# Altium footprint library TYCO THD.PcbLib: 146 footprints (part 1 of 11)
Each footprint in its own frame and in the unit in brackets; x right, y up, seen from the top. Pads: shape width x height; smd on the part's side, far side on the other; paste and mask are expansions set on the pad; w line width, h text height; cw(c..) or ccw(c..) is an arc to the next point about the centre after c.
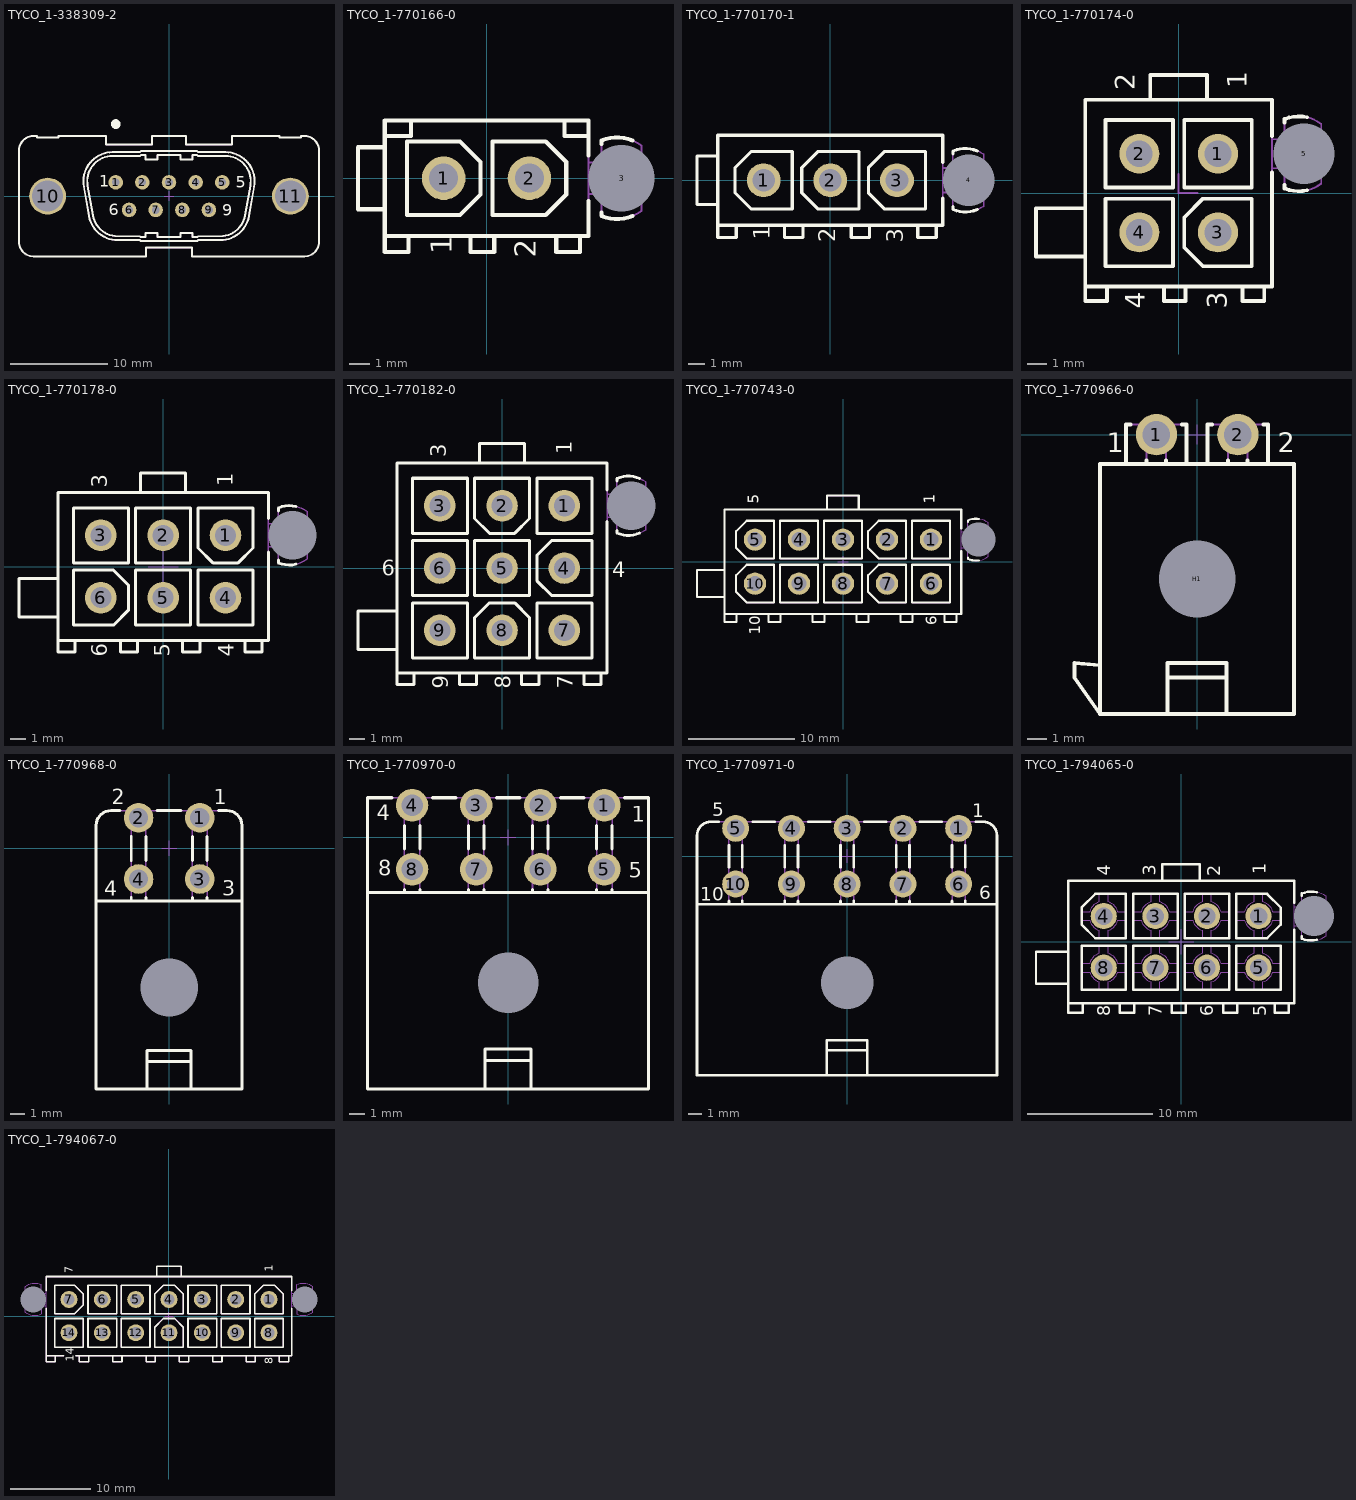
[diagram p0: the footprints below, top view; thin cyan lines are the x and y axes]

## TYCO_1-338309-2 [mm] "Straight D-SUB 9 Male Contacts Connector with Harpoons and Female Screwlock (UNC4-40)"
height 11.7
pads (11):
  round 1.5 hole 0.8: 1(-5.486,1.423) 2(-2.743,1.423) 3(0,1.423) 4(2.743,1.423) 5(5.486,1.423) 6(-4.114,-1.423) 7(-1.371,-1.423) 8(1.372,-1.423) 9(4.115,-1.423)
  round 3.8 hole 3.2: 10(-12.495,0) 11(12.495,0)
Top Overlay:
  circle w0.5: c-5.48,7.42 r0.25
  lines w0.2: -8.774,1.009 cw(c-5.82,1.53) -5.82,4.53 ; -8.774,1.009 cw(c-5.82,1.53) -5.82,4.53 ; -8.774,1.009 -8.235,-2.051 ; -8.774,1.009 -8.235,-2.051 ; -8.381,1.079 cw(c-5.82,1.53) -5.82,4.13 ; -8.381,1.079 cw(c-5.82,1.53) -5.82,4.13 ; -8.381,1.079 -7.841,-1.981 ; -8.381,1.079 -7.841,-1.981 ; -8.235,-2.051 ccw(c-5.28,-1.53) -5.28,-4.53 ; -8.235,-2.051 ccw(c-5.28,-1.53) -5.28,-4.53 ; -7.841,-1.981 ccw(c-5.28,-1.53) -5.28,-4.13 ; -7.841,-1.981 ccw(c-5.28,-1.53) -5.28,-4.13 ; -5.82,4.13 -3,4.13 ; -5.82,4.13 -3,4.13 ; -5.82,4.53 -3,4.53 ; -5.82,4.53 -3,4.53 ; -5.28,-4.53 -3,-4.53 ; -5.28,-4.53 -3,-4.53 ; -5.28,-4.13 -3,-4.13 ; -5.28,-4.13 -3,-4.13 ; -3,-4.53 -2.9,-4.63 ; -3,-4.53 -2.9,-4.63 ; -3,-4.13 -2.9,-4.23 ; -3,-4.13 -2.9,-4.23 ; -3,4.13 -2.9,4.23 ; -3,4.13 -2.9,4.23 ; -3,4.53 -2.9,4.63 ; -3,4.53 -2.9,4.63 ; -2.9,-4.63 2.9,-4.63 ; -2.9,-4.63 2.9,-4.63 ; -2.9,-4.23 -2.4,-4.23 ; -2.9,-4.23 -2.4,-4.23 ; -2.9,4.23 -2.4,4.23 ; -2.9,4.23 -2.4,4.23 ; -2.9,4.63 2.9,4.63 ; -2.9,4.63 2.9,4.63 ; -2.4,-4.23 -2.4,-3.775 ; -2.4,-4.23 -2.4,-3.775 ; -2.4,-3.775 -1.2,-3.775 ; -2.4,-3.775 -1.2,-3.775 ; -2.4,3.775 -1.2,3.775 ; -2.4,3.775 -2.4,4.23 ; -2.4,3.775 -1.2,3.775 ; -2.4,3.775 -2.4,4.23 ; -1.2,-4.23 -1.2,-3.775 ; -1.2,-4.23 1.2,-4.23 ; -1.2,-4.23 -1.2,-3.775 ; -1.2,-4.23 1.2,-4.23 ; -1.2,3.775 -1.2,4.23 ; -1.2,3.775 -1.2,4.23 ; -1.2,4.23 1.2,4.23 ; -1.2,4.23 1.2,4.23 ; 1.2,-4.23 1.2,-3.775 ; 1.2,-4.23 1.2,-3.775 ; 1.2,-3.775 2.4,-3.775 ; 1.2,-3.775 2.4,-3.775 ; 1.2,3.775 2.4,3.775 ; 1.2,3.775 1.2,4.23 ; 1.2,3.775 2.4,3.775 ; 1.2,3.775 1.2,4.23 ; 2.4,-4.23 2.4,-3.775 ; 2.4,-4.23 2.9,-4.23 ; 2.4,-4.23 2.4,-3.775 ; 2.4,-4.23 2.9,-4.23 ; 2.4,3.775 2.4,4.23 ; 2.4,3.775 2.4,4.23 ; 2.4,4.23 2.9,4.23 ; 2.4,4.23 2.9,4.23 ; 2.9,-4.63 3,-4.53 ; 2.9,-4.63 3,-4.53 ; 2.9,-4.23 3,-4.13 ; 2.9,-4.23 3,-4.13 ; 2.9,4.23 3,4.13 ; 2.9,4.23 3,4.13 ; 2.9,4.63 3,4.53 ; 2.9,4.63 3,4.53 ; 3,-4.53 5.28,-4.53 ; 3,-4.53 5.28,-4.53 ; 3,-4.13 5.28,-4.13 ; 3,-4.13 5.28,-4.13 ; 3,4.13 5.82,4.13 ; 3,4.13 5.82,4.13 ; 3,4.53 5.82,4.53 ; 3,4.53 5.82,4.53 ; 5.28,-4.53 ccw(c5.28,-1.53) 8.235,-2.051 ; 5.28,-4.53 ccw(c5.28,-1.53) 8.235,-2.051 ; 5.28,-4.13 ccw(c5.28,-1.53) 7.841,-1.981 ; 5.28,-4.13 ccw(c5.28,-1.53) 7.841,-1.981 ; 5.82,4.13 cw(c5.82,1.53) 8.381,1.079 ; 5.82,4.13 cw(c5.82,1.53) 8.381,1.079 ; 5.82,4.53 cw(c5.82,1.53) 8.774,1.009 ; 5.82,4.53 cw(c5.82,1.53) 8.774,1.009 ; 7.841,-1.981 8.381,1.079 ; 7.841,-1.981 8.381,1.079 ; 8.235,-2.051 8.774,1.009 ; 8.235,-2.051 8.774,1.009 ; -15.445,-4.7 ccw(c-13.945,-4.7) -13.945,-6.2 -2.375,-6.2 -2.375,-5.3 2.375,-5.3 2.375,-6.2 13.945,-6.2 ccw(c13.945,-4.7) 15.445,-4.7 15.445,4.7 ccw(c13.945,4.7) 13.945,6.2 13.595,6.2 13.595,6.05 11.395,6.05 11.395,6.2 6.485,6.2 6.485,5.3 1.735,5.3 1.735,6.2 -1.735,6.2 -1.735,5.3 -6.485,5.3 -6.485,6.2 -11.395,6.2 -11.395,6.05 -13.595,6.05 -13.595,6.2 -13.945,6.2 ccw(c-13.945,4.7) -15.445,4.7 -15.445,-4.7
  text "6" at -6.21,-1.97 h1.2
  text "5" at 6.855,0.87 h1.2
  text "1" at -7.18,0.945 h1.2
  text "9" at 5.485,-2.02 h1.2
Mechanical 8:
  lines w0.1: -12.995,0 -12.495,0 ; -12.495,-0.5 -12.495,0 ; -12.495,0.5 -12.495,0 ; -11.995,0 -12.495,0 ; -5.986,1.423 -5.486,1.423 ; -5.486,0.923 -5.486,1.423 ; -5.486,1.923 -5.486,1.423 ; -4.986,1.423 -5.486,1.423 ; -4.614,-1.423 -4.114,-1.423 ; -4.114,-1.923 -4.114,-1.423 ; -4.114,-0.923 -4.114,-1.423 ; -3.614,-1.423 -4.114,-1.423 ; -3.243,1.423 -2.743,1.423 ; -2.743,0.923 -2.743,1.423 ; -2.743,1.923 -2.743,1.423 ; -2.243,1.423 -2.743,1.423 ; -1.871,-1.423 -1.371,-1.423 ; -1.371,-1.923 -1.371,-1.423 ; -1.371,-0.923 -1.371,-1.423 ; -0.871,-1.423 -1.371,-1.423 ; -0.5,0 0,0 ; -0.5,1.423 0,1.423 ; 0,-0.5 0,0 ; 0,0.5 0,0 ; 0,0.923 0,1.423 ; 0,1.923 0,1.423 ; 0.5,0 0,0 ; 0.5,1.423 0,1.423 ; 0.872,-1.423 1.372,-1.423 ; 1.372,-1.923 1.372,-1.423 ; 1.372,-0.923 1.372,-1.423 ; 1.872,-1.423 1.372,-1.423 ; 2.243,1.423 2.743,1.423 ; 2.743,0.923 2.743,1.423 ; 2.743,1.923 2.743,1.423 ; 3.243,1.423 2.743,1.423 ; 3.615,-1.423 4.115,-1.423 ; 4.115,-1.923 4.115,-1.423 ; 4.115,-0.923 4.115,-1.423 ; 4.615,-1.423 4.115,-1.423 ; 4.986,1.423 5.486,1.423 ; 5.486,0.923 5.486,1.423 ; 5.486,1.923 5.486,1.423 ; 5.986,1.423 5.486,1.423 ; 11.995,0 12.495,0 ; 12.495,-0.5 12.495,0 ; 12.495,0.5 12.495,0 ; 12.995,0 12.495,0
Mechanical 14:
  circle w0.1: c12.495,0 r1.422
  circle w0.1: c-12.495,0 r1.422
  circle w0.1: c-5.486,1.422 r0.51
  circle w0.1: c-2.74,1.42 r0.51
  circle w0.1: c0,1.42 r0.51
  circle w0.1: c-4.11,-1.42 r0.51
  circle w0.1: c-1.37,-1.42 r0.51
  circle w0.1: c1.37,-1.42 r0.51
  circle w0.1: c2.74,1.42 r0.51
  circle w0.1: c5.48,1.42 r0.51
  circle w0.1: c4.11,-1.42 r0.51
  lines w0.1: -8.774,1.009 cw(c-5.82,1.53) -5.82,4.53 ; -8.774,1.009 cw(c-5.82,1.53) -5.82,4.53 ; -8.774,1.009 -8.235,-2.051 ; -8.774,1.009 -8.235,-2.051 ; -8.381,1.079 cw(c-5.82,1.53) -5.82,4.13 ; -8.381,1.079 cw(c-5.82,1.53) -5.82,4.13 ; -8.381,1.079 -7.841,-1.981 ; -8.381,1.079 -7.841,-1.981 ; -8.235,-2.051 ccw(c-5.28,-1.53) -5.28,-4.53 ; -8.235,-2.051 ccw(c-5.28,-1.53) -5.28,-4.53 ; -7.841,-1.981 ccw(c-5.28,-1.53) -5.28,-4.13 ; -7.841,-1.981 ccw(c-5.28,-1.53) -5.28,-4.13 ; -5.82,4.13 -3,4.13 ; -5.82,4.13 -3,4.13 ; -5.82,4.53 -3,4.53 ; -5.82,4.53 -3,4.53 ; -5.28,-4.53 -3,-4.53 ; -5.28,-4.53 -3,-4.53 ; -5.28,-4.13 -3,-4.13 ; -5.28,-4.13 -3,-4.13 ; -3,-4.53 -2.9,-4.63 ; -3,-4.53 -2.9,-4.63 ; -3,-4.13 -2.9,-4.23 ; -3,-4.13 -2.9,-4.23 ; -3,4.13 -2.9,4.23 ; -3,4.13 -2.9,4.23 ; -3,4.53 -2.9,4.63 ; -3,4.53 -2.9,4.63 ; -2.9,-4.63 2.9,-4.63 ; -2.9,-4.63 2.9,-4.63 ; -2.9,-4.23 -2.4,-4.23 ; -2.9,-4.23 -2.4,-4.23 ; -2.9,4.23 -2.4,4.23 ; -2.9,4.23 -2.4,4.23 ; -2.9,4.63 2.9,4.63 ; -2.9,4.63 2.9,4.63 ; -2.4,-4.23 -2.4,-3.775 ; -2.4,-4.23 -2.4,-3.775 ; -2.4,-3.775 -1.2,-3.775 ; -2.4,-3.775 -1.2,-3.775 ; -2.4,3.775 -1.2,3.775 ; -2.4,3.775 -2.4,4.23 ; -2.4,3.775 -2.4,4.23 ; -2.4,3.775 -1.2,3.775 ; -1.2,-4.23 -1.2,-3.775 ; -1.2,-4.23 1.2,-4.23 ; -1.2,-4.23 1.2,-4.23 ; -1.2,-4.23 -1.2,-3.775 ; -1.2,3.775 -1.2,4.23 ; -1.2,3.775 -1.2,4.23 ; -1.2,4.23 1.2,4.23 ; -1.2,4.23 1.2,4.23 ; 1.2,-4.23 1.2,-3.775 ; 1.2,-4.23 1.2,-3.775 ; 1.2,-3.775 2.4,-3.775 ; 1.2,-3.775 2.4,-3.775 ; 1.2,3.775 2.4,3.775 ; 1.2,3.775 1.2,4.23 ; 1.2,3.775 1.2,4.23 ; 1.2,3.775 2.4,3.775 ; 2.4,-4.23 2.4,-3.775 ; 2.4,-4.23 2.9,-4.23 ; 2.4,-4.23 2.9,-4.23 ; 2.4,-4.23 2.4,-3.775 ; 2.4,3.775 2.4,4.23 ; 2.4,3.775 2.4,4.23 ; 2.4,4.23 2.9,4.23 ; 2.4,4.23 2.9,4.23 ; 2.9,-4.63 3,-4.53 ; 2.9,-4.63 3,-4.53 ; 2.9,-4.23 3,-4.13 ; 2.9,-4.23 3,-4.13 ; 2.9,4.23 3,4.13 ; 2.9,4.23 3,4.13 ; 2.9,4.63 3,4.53 ; 2.9,4.63 3,4.53 ; 3,-4.53 5.28,-4.53 ; 3,-4.53 5.28,-4.53 ; 3,-4.13 5.28,-4.13 ; 3,-4.13 5.28,-4.13 ; 3,4.13 5.82,4.13 ; 3,4.13 5.82,4.13 ; 3,4.53 5.82,4.53 ; 3,4.53 5.82,4.53 ; 5.28,-4.53 ccw(c5.28,-1.53) 8.235,-2.051 ; 5.28,-4.53 ccw(c5.28,-1.53) 8.235,-2.051 ; 5.28,-4.13 ccw(c5.28,-1.53) 7.841,-1.981 ; 5.28,-4.13 ccw(c5.28,-1.53) 7.841,-1.981 ; 5.82,4.13 cw(c5.82,1.53) 8.381,1.079 ; 5.82,4.13 cw(c5.82,1.53) 8.381,1.079 ; 5.82,4.53 cw(c5.82,1.53) 8.774,1.009 ; 5.82,4.53 cw(c5.82,1.53) 8.774,1.009 ; 7.841,-1.981 8.381,1.079 ; 7.841,-1.981 8.381,1.079 ; 8.235,-2.051 8.774,1.009 ; 8.235,-2.051 8.774,1.009 ; -15.445,-4.7 ccw(c-13.945,-4.7) -13.945,-6.2 -2.375,-6.2 -2.375,-5.3 2.375,-5.3 2.375,-6.2 13.945,-6.2 ccw(c13.945,-4.7) 15.445,-4.7 15.445,4.7 ccw(c13.945,4.7) 13.945,6.2 13.595,6.2 13.595,6.05 11.395,6.05 11.395,6.2 6.485,6.2 6.485,5.3 1.735,5.3 1.735,6.2 -1.735,6.2 -1.735,5.3 -6.485,5.3 -6.485,6.2 -11.395,6.2 -11.395,6.05 -13.595,6.05 -13.595,6.2 -13.945,6.2 ccw(c-13.945,4.7) -15.445,4.7 -15.445,-4.7
  text "9 D-Sub Male" at -6.053,4.872 h1.2
3D body "TYCO_1-338309-2.stp": height 11.95, standoff -3.2, extent -15.445,-6.2 15.445,6.2

## TYCO_1-770166-0 [mm] "2 Circuits In-Line - Mini-Universal MATE-N-LOK Connector"
height 14.25
pads (3):
  round 2.1 hole 1.4: 1(-2.07,0) 2(2.07,0)
  round 0.5 hole 3.2 unplated mask+1.35: 3(6.52,0)
Top Overlay:
  lines w0.2: -4.915,-1.499 -6.21,-1.499 -6.21,1.499 -4.915,1.499 ; -4.915,2.032 -3.645,2.032 -3.645,2.794 ; -3.772,-2.794 -3.772,-3.556 -4.915,-3.556 -4.915,-2.794 ; -0.775,-2.794 -0.775,-3.556 0.368,-3.556 0.368,-2.794 ; 3.366,-2.794 3.366,-3.556 4.509,-3.556 4.509,-2.794 ; 3.772,2.794 3.772,2.032 4.915,2.032 ; 4.915,-1.1 4.915,-2.794 -4.915,-2.794 ; 4.915,1.1 4.915,2.794 -4.915,2.794 -4.915,-2.794 ; 5.55,-1.651 5.55,-1.815 ccw(c6.312,0) 7.053,-1.824 ; 5.55,1.651 5.55,1.815 cw(c6.312,0) 7.053,1.824 ; -3.848,-1.778 -3.848,1.778 -1.283,1.778 -0.292,0.787 -0.292,-0.787 -1.283,-1.778 -3.848,-1.778 ; 0.292,-1.778 0.292,1.778 2.858,1.778 3.848,0.787 3.848,-0.787 2.858,-1.778 0.292,-1.778
  text "1" at -1.689,-3.683 h1.02
  text "2" at 2.375,-3.835 h1.02
Mechanical 14:
  circle w0.1: c-2.07,0 r0.5
  circle w0.1: c2.07,0 r0.5
  lines w0.1: -4.915,-1.499 -6.21,-1.499 -6.21,1.499 -4.915,1.499 ; -4.915,2.032 -3.645,2.032 -3.645,2.794 ; -3.772,-2.794 -3.772,-3.556 -4.915,-3.556 -4.915,-2.794 ; -0.775,-2.794 -0.775,-3.556 0.368,-3.556 0.368,-2.794 ; 3.366,-2.794 3.366,-3.556 4.509,-3.556 4.509,-2.794 ; 3.772,2.794 3.772,2.032 4.915,2.032 ; 4.915,-0.762 5.55,-0.762 5.55,-1.815 ccw(c6.312,0) 7.48,-1.584 7.48,1.584 ccw(c6.312,0) 5.55,1.815 5.55,0.762 4.915,0.762 ; -4.915,-2.794 -4.915,2.794 4.915,2.794 4.915,-2.794 -4.915,-2.794 ; -3.848,-1.778 -3.848,1.778 -1.283,1.778 -0.292,0.787 -0.292,-0.787 -1.283,-1.778 -3.848,-1.778 ; 0.292,-1.778 0.292,1.778 2.858,1.778 3.848,0.787 3.848,-0.787 2.858,-1.778 0.292,-1.778
  text "1" at -1.689,-3.683 h1.02
  text "2" at 2.375,-3.835 h1.02
3D body "TYCO_1-770166-0.stp": height 14.25, standoff -4.32, extent -6.21,-3.556 7.481,2.794

## TYCO_1-770170-1 [mm] "3 Circuits In-Line - Mini-Universal MATE-N-LOK Connector"
height 14.25
pads (4):
  round 2.1 hole 1.4: 1(-4.14,0) 2(0,0) 3(4.14,0)
  round 0.5 hole 3.2 unplated mask+1.35: 4(8.59,0)
Top Overlay:
  lines w0.2: -6.985,-2.794 6.985,-2.794 6.985,-1.1 ; -6.985,-1.499 -8.28,-1.499 -8.28,1.499 -6.985,1.499 ; -5.842,-2.794 -5.842,-3.556 -6.985,-3.556 -6.985,2.794 6.985,2.794 6.985,1.1 ; -2.845,-2.794 -2.845,-3.556 -1.702,-3.556 -1.702,-2.794 ; 1.295,-2.794 1.295,-3.556 2.438,-3.556 2.438,-2.794 ; 5.436,-2.794 5.436,-3.556 6.579,-3.556 6.579,-2.794 ; 7.62,-1.651 7.62,-1.815 ccw(c8.382,0) 9.123,-1.824 ; 7.62,1.651 7.62,1.815 cw(c8.382,0) 9.123,1.824 ; -5.918,-0.787 -5.918,0.787 -4.928,1.778 -2.362,1.778 -2.362,-1.778 -4.928,-1.778 -5.918,-0.787 ; -1.778,-0.787 -1.778,0.787 -0.787,1.778 1.778,1.778 1.778,-1.778 -0.787,-1.778 -1.778,-0.787 ; 2.362,-0.787 3.353,-1.778 5.918,-1.778 5.918,1.778 3.353,1.778 2.362,0.787 2.362,-0.787
  text "3" at 4.521,-3.883 h1.02
  text "1" at -3.759,-3.683 h1.02
  text "2" at 0.305,-3.86 h1.02
Mechanical 8:
  lines w0.1: -4.64,0 -4.14,0 ; -4.14,-0.5 -4.14,0 ; -4.14,0.5 -4.14,0 ; -3.64,0 -4.14,0 ; -0.5,0 0,0 ; 0,-0.5 0,0 ; 0,0.5 0,0 ; 0.5,0 0,0 ; 3.64,0 4.14,0 ; 4.14,-0.5 4.14,0 ; 4.14,0.5 4.14,0 ; 4.64,0 4.14,0 ; 8.09,0 8.59,0 ; 8.59,-0.5 8.59,0 ; 8.59,0.5 8.59,0 ; 9.09,0 8.59,0
Mechanical 14:
  circle w0.1: c-4.14,0 r0.5
  circle w0.1: c0,0 r0.5
  circle w0.1: c4.14,0 r0.5
  lines w0.1: -6.985,-2.794 6.985,-2.794 6.985,2.794 -6.985,2.794 -6.985,-3.556 -5.842,-3.556 -5.842,-2.794 ; -6.985,-1.499 -8.28,-1.499 -8.28,1.499 -6.985,1.499 ; -2.845,-2.794 -2.845,-3.556 -1.702,-3.556 -1.702,-2.794 ; 1.295,-2.794 1.295,-3.556 2.438,-3.556 2.438,-2.794 ; 5.436,-2.794 5.436,-3.556 6.579,-3.556 6.579,-2.794 ; 6.985,-0.762 7.595,-0.762 ; 6.985,0.762 7.595,0.762 ; 7.62,-0.795 7.62,0.795 ; 9.525,-0.881 cw(c8.611,0) 7.595,-0.762 ; 9.525,0.881 ccw(c8.611,0) 7.595,0.762 ; 7.595,-0.762 7.595,-1.804 ccw(c8.382,0) 9.525,-1.603 9.525,1.603 ccw(c8.382,0) 7.595,1.804 7.595,0.762 ; -5.918,-0.787 -5.918,0.787 -4.928,1.778 -2.362,1.778 -2.362,-1.778 -4.928,-1.778 -5.918,-0.787 ; -1.778,-0.787 -1.778,0.787 -0.787,1.778 1.778,1.778 1.778,-1.778 -0.787,-1.778 -1.778,-0.787 ; 2.362,-0.787 3.353,-1.778 5.918,-1.778 5.918,1.778 3.353,1.778 2.362,0.787 2.362,-0.787
  text "3" at 4.521,-3.883 h1.02
  text "1" at -3.759,-3.683 h1.02
  text "2" at 0.305,-3.86 h1.02
3D body "TYCO_1-770170-1.stp": height 14.25, standoff -4.32, extent -8.28,-3.556 9.525,2.794

## TYCO_1-770174-0 [mm] "4 Circuits Dual-Row - Mini-Universal MATE-N-LOK Connector"
height 14.25
pads (5):
  round 2.1 hole 1.4: 1(2.07,2.07) 2(-2.07,2.07) 3(2.07,-2.07) 4(-2.07,-2.07)
  round 0.5 hole 3.2 unplated mask+1.35: 5(6.604,2.07)
Top Overlay:
  lines w0.2: -4.915,-3.34 -7.506,-3.34 -7.506,-0.8 -4.915,-0.8 ; -3.772,-4.915 -3.772,-5.677 -4.915,-5.677 -4.915,-4.915 ; -1.499,4.915 -1.499,6.21 1.499,6.21 1.499,4.915 ; -0.775,-4.915 -0.775,-5.677 0.368,-5.677 0.368,-4.915 ; 3.366,-4.915 3.366,-5.677 4.509,-5.677 4.509,-4.915 ; 4.915,1.1 4.915,-4.915 -4.915,-4.915 ; 4.915,3 4.915,4.915 -4.915,4.915 -4.915,-4.915 ; 5.575,0.44 5.575,0.245 ccw(c6.312,2.07) 6.753,0.152 ; 5.575,3.7 5.575,3.896 cw(c6.312,2.07) 6.753,3.989 ; -3.848,-3.848 -0.292,-3.848 -0.292,-0.292 -3.848,-0.292 -3.848,-3.848 ; -3.848,0.292 -3.848,3.848 -0.292,3.848 -0.292,0.292 -3.848,0.292 ; 0.292,-2.858 1.283,-3.848 3.848,-3.848 3.848,-0.292 1.283,-0.292 0.292,-1.283 0.292,-2.858 ; 0.292,0.292 0.292,3.848 3.848,3.848 3.848,0.292 0.292,0.292
  text "3" at 2.54,-6.096 h1.02
  text "4" at -1.778,-6.096 h1.02
  text "2" at -2.311,5.409 h1.02
  text "1" at 3.581,5.513 h1.02
Mechanical 8:
  lines w0.1: 0,1 0,0 1,0
Mechanical 14:
  circle w0.1: c-2.07,2.07 r0.5
  circle w0.1: c2.07,2.07 r0.5
  circle w0.1: c-2.07,-2.07 r0.5
  circle w0.1: c2.07,-2.07 r0.5
  lines w0.1: -4.915,-3.34 -7.506,-3.34 -7.506,-0.8 -4.915,-0.8 ; -3.772,-4.915 -3.772,-5.677 -4.915,-5.677 -4.915,-4.915 ; -1.499,4.915 -1.499,6.21 1.499,6.21 1.499,4.915 ; -0.775,-4.915 -0.775,-5.677 0.368,-5.677 0.368,-4.915 ; 3.366,-4.915 3.366,-5.677 4.509,-5.677 4.509,-4.915 ; 4.915,1.308 5.575,1.308 5.575,0.245 ccw(c6.312,2.07) 7.506,0.505 7.506,3.635 ccw(c6.312,2.07) 5.575,3.896 5.575,2.832 4.915,2.832 ; 5.575,1.245 ccw(c6.541,2.07) 7.506,1.245 ; 5.575,2.896 cw(c6.541,2.07) 7.506,2.896 ; -4.915,-4.915 4.915,-4.915 4.915,4.915 -4.915,4.915 -4.915,-4.915 ; -3.848,-3.848 -0.292,-3.848 -0.292,-0.292 -3.848,-0.292 -3.848,-3.848 ; -3.848,0.292 -3.848,3.848 -0.292,3.848 -0.292,0.292 -3.848,0.292 ; 0.292,-2.858 1.283,-3.848 3.848,-3.848 3.848,-0.292 1.283,-0.292 0.292,-1.283 0.292,-2.858 ; 0.292,0.292 0.292,3.848 3.848,3.848 3.848,0.292 0.292,0.292
  text "3" at 2.54,-6.096 h1.02
  text "4" at -1.778,-6.096 h1.02
  text "2" at -2.311,5.409 h1.02
  text "1" at 3.581,5.513 h1.02
3D body "TYCO_1-770174-0.stp": height 14.25, standoff -4.32, extent -7.506,-5.677 7.506,6.21

## TYCO_1-770178-0 [mm] "6 Circuits Vertiacal Mini-Universal MATE-N-LOK Connector"
height 14.25
pads (7):
  round 2.1 hole 1.4: 1(4.14,2.07) 2(0,2.07) 3(-4.14,2.07) 4(4.14,-2.07) 5(0,-2.07) 6(-4.14,-2.07)
  round 0.5 hole 3.2 unplated mask+1.35: H1(8.59,2.07)
Top Overlay:
  lines w0.2: -6.985,-3.34 -9.576,-3.34 -9.576,-0.8 -6.985,-0.8 ; -5.842,-4.915 -5.842,-5.677 -6.985,-5.677 -6.985,-4.915 ; -2.845,-4.915 -2.845,-5.677 -1.702,-5.677 -1.702,-4.915 ; -1.499,4.915 -1.499,6.21 1.499,6.21 1.499,4.915 ; 1.295,-4.915 1.295,-5.677 2.438,-5.677 2.438,-4.915 ; 5.436,-4.915 5.436,-5.677 6.579,-5.677 6.579,-4.915 ; 6.985,0.976 6.985,-4.915 -6.985,-4.915 ; 6.985,3.176 6.985,4.915 -6.985,4.915 -6.985,-4.915 ; 7.645,0.44 7.645,0.245 ccw(c8.382,2.07) 8.823,0.152 ; 7.645,3.7 7.645,3.896 cw(c8.382,2.07) 8.823,3.989 ; -5.969,-3.899 -3.299,-3.899 -2.311,-2.911 -2.311,-1.229 -3.299,-0.241 -5.969,-0.241 -5.969,-3.899 ; -5.969,0.241 -2.311,0.241 -2.311,3.899 -5.969,3.899 -5.969,0.241 ; -1.829,-3.899 1.829,-3.899 1.829,-0.241 -1.829,-0.241 -1.829,-3.899 ; -1.829,0.241 1.829,0.241 1.829,3.899 -1.829,3.899 -1.829,0.241 ; 2.311,-3.899 5.969,-3.899 5.969,-0.241 2.311,-0.241 2.311,-3.899 ; 2.311,1.229 2.311,3.899 5.969,3.899 5.969,1.229 4.981,0.241 3.299,0.241 2.311,1.229
  text "1" at 4.63,5.318 h1.02
  text "3" at -3.725,5.245 h1.02
  text "4" at 4.695,-6.001 h1.02
  text "5" at 0.428,-6.001 h1.02
  text "6" at -3.712,-6.001 h1.02
Mechanical 8:
  lines w0.05: -5.14,-2.07 -4.14,-2.07 ; -5.14,2.07 -4.14,2.07 ; -4.14,-3.07 -4.14,-2.07 ; -4.14,-1.07 -4.14,-2.07 ; -4.14,1.07 -4.14,2.07 ; -4.14,3.07 -4.14,2.07 ; -3.14,-2.07 -4.14,-2.07 ; -3.14,2.07 -4.14,2.07 ; -1,-2.07 0,-2.07 ; -1,0 0,0 ; -1,2.07 0,2.07 ; 0,-3.07 0,-2.07 ; 0,-1.07 0,-2.07 ; 0,-1 0,0 ; 0,1 0,0 ; 0,1.07 0,2.07 ; 0,3.07 0,2.07 ; 1,-2.07 0,-2.07 ; 1,0 0,0 ; 1,2.07 0,2.07 ; 3.14,-2.07 4.14,-2.07 ; 3.14,2.07 4.14,2.07 ; 4.14,-3.07 4.14,-2.07 ; 4.14,-1.07 4.14,-2.07 ; 4.14,1.07 4.14,2.07 ; 4.14,3.07 4.14,2.07 ; 5.14,-2.07 4.14,-2.07 ; 5.14,2.07 4.14,2.07 ; 7.59,2.07 8.59,2.07 ; 8.59,1.07 8.59,2.07 ; 8.59,3.07 8.59,2.07 ; 9.59,2.07 8.59,2.07
Mechanical 14:
  circle w0.1: c-4.14,-2.07 r0.5
  circle w0.1: c0,-2.07 r0.5
  circle w0.1: c4.14,-2.07 r0.5
  circle w0.1: c4.14,2.07 r0.5
  circle w0.1: c0,2.07 r0.5
  circle w0.1: c-4.14,2.07 r0.5
  lines w0.1: -6.985,-3.34 -9.576,-3.34 -9.576,-0.8 -6.985,-0.8 ; -5.842,-4.915 -5.842,-5.677 -6.985,-5.677 -6.985,-4.915 ; -2.845,-4.915 -2.845,-5.677 -1.702,-5.677 -1.702,-4.915 ; -1.499,4.915 -1.499,6.21 1.499,6.21 1.499,4.915 ; 1.295,-4.915 1.295,-5.677 2.438,-5.677 2.438,-4.915 ; 5.436,-4.915 5.436,-5.677 6.579,-5.677 6.579,-4.915 ; 6.985,1.308 7.645,1.308 ; 6.985,2.832 7.645,2.832 ; 7.645,1.245 ccw(c8.611,2.07) 9.576,1.245 ; 7.645,2.896 cw(c8.611,2.07) 9.576,2.896 ; -6.985,-4.915 6.985,-4.915 6.985,4.915 -6.985,4.915 -6.985,-4.915 ; -5.969,-3.899 -3.299,-3.899 -2.311,-2.911 -2.311,-1.229 -3.299,-0.241 -5.969,-0.241 -5.969,-3.899 ; -5.969,0.241 -2.311,0.241 -2.311,3.899 -5.969,3.899 -5.969,0.241 ; -1.829,-3.899 1.829,-3.899 1.829,-0.241 -1.829,-0.241 -1.829,-3.899 ; -1.829,0.241 1.829,0.241 1.829,3.899 -1.829,3.899 -1.829,0.241 ; 2.311,-3.899 5.969,-3.899 5.969,-0.241 2.311,-0.241 2.311,-3.899 ; 2.311,1.229 2.311,3.899 5.969,3.899 5.969,1.229 4.981,0.241 3.299,0.241 2.311,1.229 ; 7.645,0.245 ccw(c8.382,2.07) 9.576,0.505 9.576,3.635 ccw(c8.382,2.07) 7.645,3.896 7.645,0.245
  text "1" at 4.63,5.318 h1.02
  text "3" at -3.725,5.245 h1.02
  text "4" at 4.695,-6.001 h1.02
  text "5" at 0.428,-6.001 h1.02
  text "6" at -3.712,-6.001 h1.02
3D body "TYCO_1-770178-0.stp": height 14.25, standoff -4.32, extent -9.576,-5.677 9.576,6.21

## TYCO_1-770182-0 [mm] "9 Circuits Vertiacal Mini-Universal MATE-N-LOK Connector"
height 14.25
pads (10):
  round 2.1 hole 1.4: 1(4.14,4.14) 2(0,4.14) 3(-4.14,4.14) 4(4.14,0) 5(0,0) 6(-4.14,0) 7(4.14,-4.14) 8(0,-4.14) 9(-4.14,-4.14)
  round 0.5 hole 3.2 unplated mask+1.35: 10(8.59,4.14)
Top Overlay:
  lines w0.2: -6.985,-5.41 -9.576,-5.41 -9.576,-2.87 -6.985,-2.87 ; -5.842,-6.985 -5.842,-7.747 -6.985,-7.747 -6.985,-6.985 ; -2.845,-6.985 -2.845,-7.747 -1.702,-7.747 -1.702,-6.985 ; -1.499,6.985 -1.499,8.28 1.499,8.28 1.499,6.985 ; 1.295,-6.985 1.295,-7.747 2.438,-7.747 2.438,-6.985 ; 5.436,-6.985 5.436,-7.747 6.579,-7.747 6.579,-6.985 ; 6.977,-6.985 6.977,3.1 ; 6.977,5.2 6.977,6.985 ; 6.985,-6.985 -6.985,-6.985 ; 6.985,6.985 -6.985,6.985 -6.985,-6.985 ; 7.633,2.504 7.633,2.325 ccw(c8.395,4.14) 9.147,2.321 ; 7.633,5.777 7.633,5.955 cw(c8.395,4.14) 9.147,5.959 ; -5.969,-5.969 -2.311,-5.969 -2.311,-2.311 -5.969,-2.311 -5.969,-5.969 ; -5.969,-1.829 -2.311,-1.829 -2.311,1.829 -5.969,1.829 -5.969,-1.829 ; -5.969,2.311 -2.311,2.311 -2.311,5.969 -5.969,5.969 -5.969,2.311 ; -1.829,-5.969 -1.829,-3.299 -0.841,-2.311 0.841,-2.311 1.829,-3.299 1.829,-5.969 -1.829,-5.969 ; -1.829,-1.829 1.829,-1.829 1.829,1.829 -1.829,1.829 -1.829,-1.829 ; -1.829,3.299 -1.829,5.969 1.829,5.969 1.829,3.299 0.841,2.311 -0.841,2.311 -1.829,3.299 ; 2.311,-5.969 5.969,-5.969 5.969,-2.311 2.311,-2.311 2.311,-5.969 ; 2.311,-0.841 2.311,0.841 3.299,1.829 5.969,1.829 5.969,-1.829 3.299,-1.829 2.311,-0.841 ; 2.311,2.311 5.969,2.311 5.969,5.969 2.311,5.969 2.311,2.311
  text "6" at -7.982,-0.505 h1.02
  text "4" at 7.318,-0.605 h1.02
  text "9" at -3.575,-8.032 h1.02
  text "8" at 0.565,-8.032 h1.02
  text "7" at 4.705,-8.032 h1.02
  text "3" at -3.715,7.355 h1.02
  text "1" at 4.64,7.555 h1.02
Mechanical 8:
  lines w0.1: -5.14,-4.14 -4.14,-4.14 ; -5.14,0 -4.14,0 ; -5.14,4.14 -4.14,4.14 ; -4.14,-5.14 -4.14,-4.14 ; -4.14,-3.14 -4.14,-4.14 ; -4.14,-1 -4.14,0 ; -4.14,1 -4.14,0 ; -4.14,3.14 -4.14,4.14 ; -4.14,5.14 -4.14,4.14 ; -3.14,-4.14 -4.14,-4.14 ; -3.14,0 -4.14,0 ; -3.14,4.14 -4.14,4.14 ; -1,-4.14 0,-4.14 ; -1,4.14 0,4.14 ; 0,-5.14 0,-4.14 ; 0,-3.14 0,-4.14 ; 0,3.14 0,4.14 ; 0,5.14 0,4.14 ; 1,-4.14 0,-4.14 ; 1,4.14 0,4.14 ; 3.14,-4.14 4.14,-4.14 ; 3.14,0 4.14,0 ; 3.14,4.14 4.14,4.14 ; 4.14,-5.14 4.14,-4.14 ; 4.14,-3.14 4.14,-4.14 ; 4.14,-1 4.14,0 ; 4.14,1 4.14,0 ; 4.14,3.14 4.14,4.14 ; 4.14,5.14 4.14,4.14 ; 5.14,-4.14 4.14,-4.14 ; 5.14,0 4.14,0 ; 5.14,4.14 4.14,4.14 ; 7.59,4.14 8.59,4.14 ; 8.59,3.14 8.59,4.14 ; 8.59,5.14 8.59,4.14 ; 9.59,4.14 8.59,4.14 ; 0,0 -1,0 0,0 ; 0,0 1,0 0,0 ; 0,0 0,1 0,0 ; 0,0 0,-1 0,0
Mechanical 14:
  circle w0.1: c-4.14,4.14 r0.5
  circle w0.1: c0,4.14 r0.5
  circle w0.1: c4.14,4.14 r0.5
  circle w0.1: c4.14,0 r0.5
  circle w0.1: c0,0 r0.5
  circle w0.1: c-4.14,0 r0.5
  circle w0.1: c-4.14,-4.14 r0.5
  circle w0.1: c0,-4.14 r0.5
  circle w0.1: c4.14,-4.14 r0.5
  lines w0.1: -6.985,-5.41 -9.576,-5.41 -9.576,-2.87 -6.985,-2.87 ; -5.842,-6.985 -5.842,-7.747 -6.985,-7.747 -6.985,-6.985 ; -2.845,-6.985 -2.845,-7.747 -1.702,-7.747 -1.702,-6.985 ; -1.499,6.985 -1.499,8.28 1.499,8.28 1.499,6.985 ; 1.295,-6.985 1.295,-7.747 2.438,-7.747 2.438,-6.985 ; 2.311,-0.841 3.299,-1.829 5.969,-1.829 5.969,1.829 3.299,1.829 2.311,0.841 ; 5.436,-6.985 5.436,-7.747 6.579,-7.747 6.579,-6.985 ; 6.998,3.378 7.633,3.378 ; 6.998,4.902 7.633,4.902 ; 7.633,3.315 ccw(c8.598,4.14) 9.563,3.315 ; 7.633,4.966 cw(c8.598,4.14) 9.563,4.966 ; -6.985,-6.985 6.985,-6.985 6.985,6.985 -6.985,6.985 -6.985,-6.985 ; -5.969,-5.969 -2.311,-5.969 -2.311,-2.311 -5.969,-2.311 -5.969,-5.969 ; -5.969,-1.829 -2.311,-1.829 -2.311,1.829 -5.969,1.829 -5.969,-1.829 ; -5.969,2.311 -2.311,2.311 -2.311,5.969 -5.969,5.969 -5.969,2.311 ; -1.829,-5.969 -1.829,-3.299 -0.841,-2.311 0.841,-2.311 1.829,-3.299 1.829,-5.969 -1.829,-5.969 ; -1.829,-1.829 1.829,-1.829 1.829,1.829 -1.829,1.829 -1.829,-1.829 ; -1.829,3.299 -1.829,5.969 1.829,5.969 1.829,3.299 0.841,2.311 -0.841,2.311 -1.829,3.299 ; 2.311,-5.969 5.969,-5.969 5.969,-2.311 2.311,-2.311 2.311,-5.969 ; 2.311,2.311 5.969,2.311 5.969,5.969 2.311,5.969 2.311,2.311 ; 7.633,2.325 ccw(c8.395,4.14) 9.563,2.556 9.563,5.724 ccw(c8.395,4.14) 7.633,5.955 7.633,2.325